# Altium footprint library Stepper_Board.PcbLib: 49 footprints (part 2 of 4)
Each footprint in its own frame and in the unit in brackets; x right, y up, seen from the top. Pads: shape width x height; smd on the part's side, far side on the other; paste and mask are expansions set on the pad; w line width, h text height; cw(c..) or ccw(c..) is an arc to the next point about the centre after c.
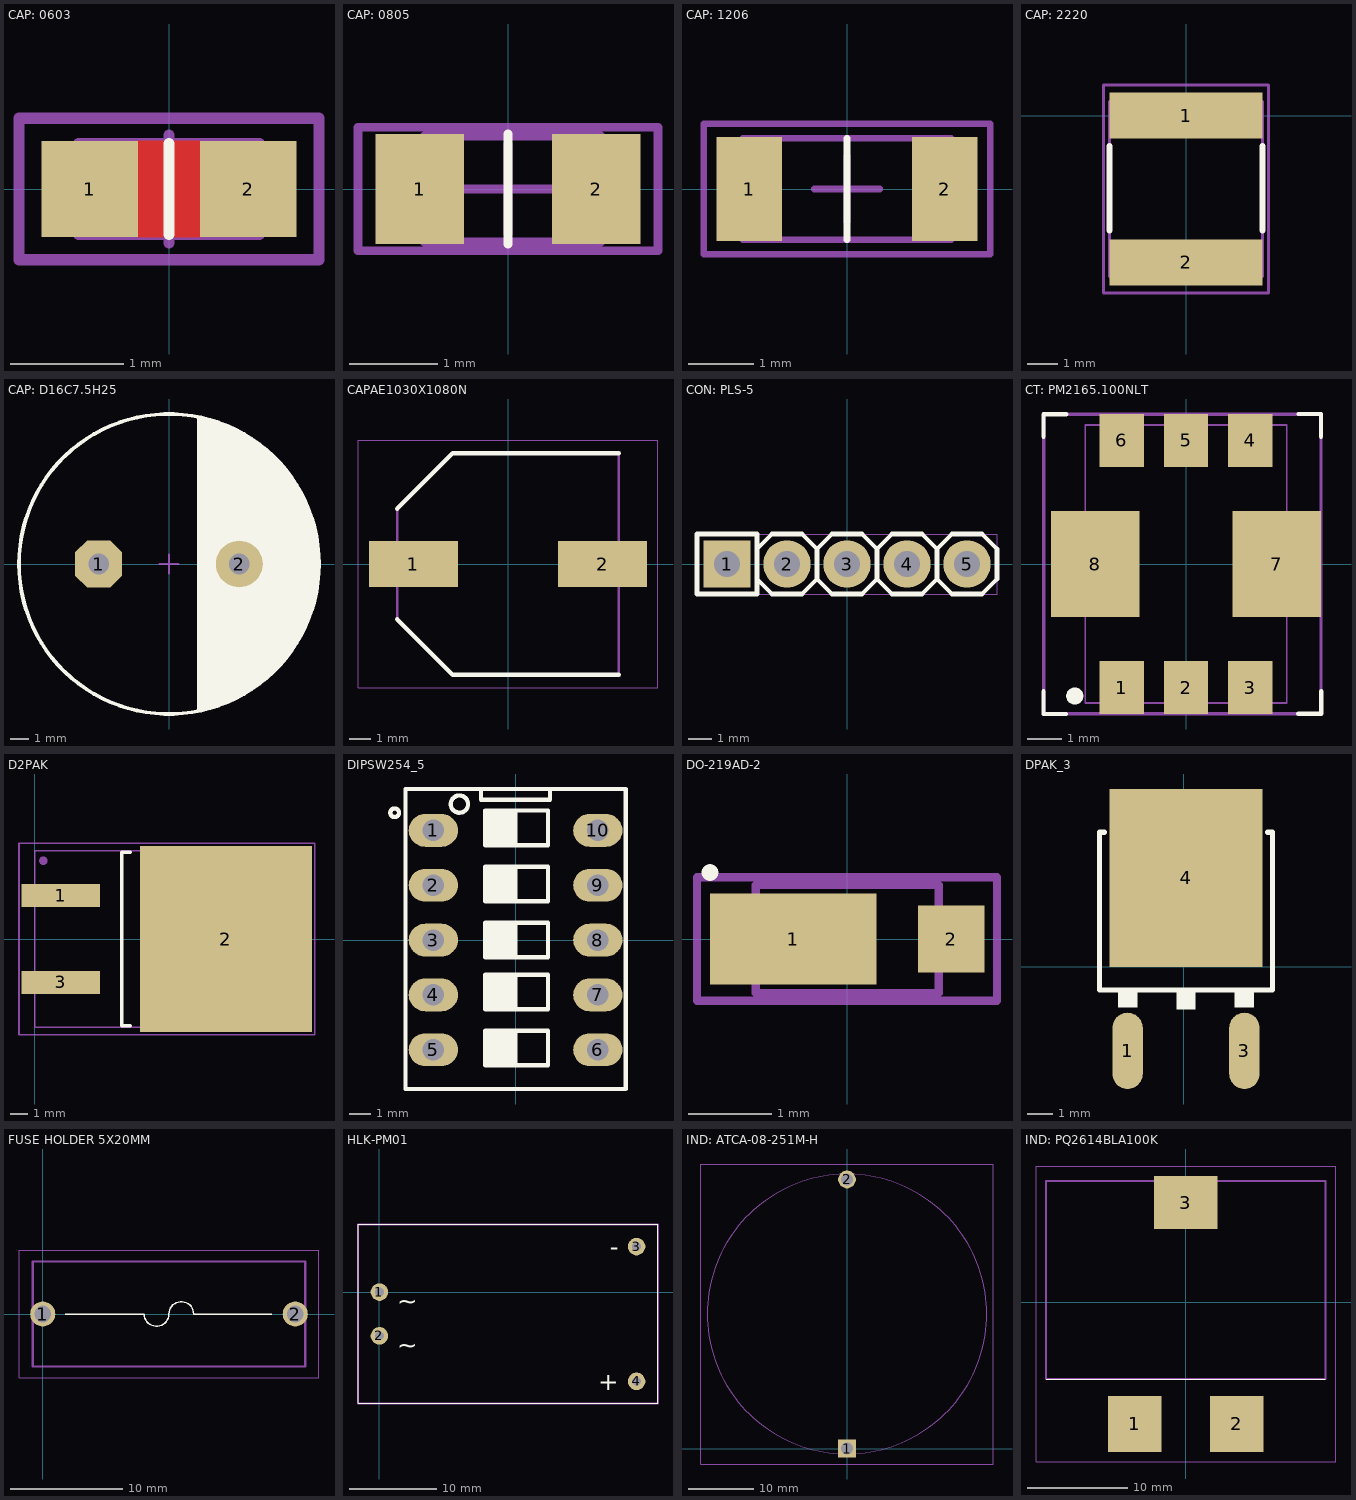
[diagram p1: the footprints below, top view; thin cyan lines are the x and y axes]

## CAP: 0603 [mm]
height 0.45
pads (2):
  rect 0.85x0.85 smd: 1(-0.7,0) 2(0.7,0)
Top Layer:
  pour cut-out: -0.275,0.425 -0.275,-0.425 0.275,-0.425 0.275,0.425
Top Overlay:
  lines w0.1: 0,-0.4 0,0.4
Mechanical 1:
  lines w0.1: -0.8,-0.4 -0.8,0.4 0.8,0.4 0.8,-0.4 -0.8,-0.4
Mechanical 15:
  lines w0.1: -0.475,0 0.475,0 ; 0,-0.475 0,0.475 ; -1.325,-0.625 1.325,-0.625 1.325,0.625 -1.325,0.625 -1.325,-0.625
3D body "SW3dPS-0603 SMD Capacitor.STEP": height 0.3, standoff 0, extent -0.8,-0.4 0.8,0.4

## CAP: 0805 [mm]
height 0.45
pads (2):
  rect 1x1.25 smd: 1(-1,0) 2(1,0)
Top Overlay:
  lines w0.1: 0,-0.625 0,0.625
Mechanical 1:
  lines w0.1: -0.949,-0.6 -0.949,0.6 1.05,0.6 1.05,-0.6 -0.949,-0.6
Mechanical 15:
  lines w0.1: -0.5,0 0.5,0 ; 0,-0.5 0,0.5 ; -1.7,-0.7 1.7,-0.7 1.7,0.7 -1.7,0.7 -1.7,-0.7
3D body "SW3dPS-0805 SMD Capacitor.STEP": height 0.78, standoff 0, extent -1,-0.625 1,0.625

## CAP: 1206 [mm]
height 0.6
pads (2):
  rect 1x1.6 smd: 1(-1.5,0) 2(1.5,0)
Top Overlay:
  lines w0.1: 0,-0.775 0,0.775
Mechanical 1:
  lines w0.1: -1.6,-0.775 1.6,-0.775 1.6,0.775 -1.6,0.775 -1.6,-0.775
Mechanical 15:
  lines w0.1: -0.5,0 0.5,0 ; 0,-0.5 0,0.5 ; -2.2,-1 -2.2,1 2.2,1 2.2,-1 -2.2,-1
3D body "SW3dPS-1206 SMD Capacitor.STEP": height 1, standoff 0, extent -1.6,-0.8 1.6,0.8

## CAP: 2220 [mm]
pads (2):
  rect 5x1.5 smd: 1(0,0) 2(0,-4.8)
Top Overlay:
  lines w0.2: -2.5,-3.75 -2.5,-1 ; 2.5,-3.75 2.5,-1
Mechanical 1:
  lines w0.1: -2.5,-5.25 2.5,-5.25 2.5,0.45 -2.5,0.45 -2.5,-5.25
Mechanical 15:
  lines w0.1: -2.7,-5.8 -2.7,1 -2,1 2.7,1 2.7,-5.8 -2.7,-5.8
3D body "User Library-CAPC5750X23.STEP": height 2.3, standoff 0, extent -2.5,-5.25 2.5,0.45

## CAP: D16C7.5H25 [mm]
height 25
pads (2):
  oct 2.5x2.5 hole 1.1: 1(-3.75,0)
  round 2.5 hole 1.1: 2(3.75,0)
Top Overlay:
  circle w0.2: c0,0 r8
  region: 1.5,7.85 2.1,7.75 2.85,7.5 4.175,6.825 5.375,5.95 6.2,5.05 7.075,3.8 7.525,2.75 7.875,1.425 8,0 7.875,-1.375 7.725,-2.25 7.075,-3.75 6.65,-4.45 6.025,-5.25 5.475,-5.85 4.7,-6.475 3.975,-6.95 3.175,-7.35 2.3,-7.675 1.5,-7.85
Mechanical 1:
  circle w0.1: c0,0 r8
  region: 1.5,7.85 2.1,7.75 2.85,7.5 4.175,6.825 5.375,5.95 6.2,5.05 7.075,3.8 7.525,2.75 7.875,1.425 8,0 7.875,-1.375 7.725,-2.25 7.075,-3.75 6.65,-4.45 6.025,-5.25 5.475,-5.85 4.7,-6.475 3.975,-6.95 3.175,-7.35 2.3,-7.675 1.5,-7.85
Mechanical 15:
  circle w0.1: c0,0 r8
  lines w0.1: -0.5,0 0.5,0 ; 0,-0.5 0,0.5
3D body "User Library-CapAluRadial_D160H250.STEP": height 27, standoff -3, extent -8.25,-8.249 8.25,8.249

## CAPAE1030X1080N [mm]
pads (2):
  rect 4.15x2.15 smd: 1(-4.4,0) 2(4.4,0)
Top Overlay:
  lines w0.2: -5.15,-2.575 -2.575,-5.15 5.15,-5.15 ; -5.15,2.575 -2.575,5.15 5.15,5.15
Mechanical 13:
  lines w0.1: -5.15,-2.575 -2.575,-5.15 5.15,-5.15 5.15,5.15 -2.575,5.15 -5.15,2.575 -5.15,-2.575
Mechanical 15:
  lines w0.05: -6.975,-5.75 -6.975,5.75 6.975,5.75 6.975,-5.75 -6.975,-5.75
3D body "UWT1V331MNL1GS.stp": height 10.8, standoff 0, extent -5.75,-5.25 5.75,5.25

## CON: PLS-5 [mm]
height 10
pads (5):
  rect 2x2 hole 1.1: 1(-5.08,0)
  round 2 hole 1.1: 2(-2.54,0) 3(0,0) 4(2.54,0) 5(5.08,0)
Top Overlay:
  lines w0.2: -3.81,-0.635 -3.175,-1.27 -1.905,-1.27 -1.27,-0.635 ; -3.81,0.635 -3.175,1.27 -1.905,1.27 -1.27,0.635 ; -1.27,-0.635 -1.27,0.635 ; -1.27,-0.635 -0.635,-1.27 0.635,-1.27 1.27,-0.635 ; -1.27,0.635 -0.635,1.27 0.635,1.27 1.27,0.635 ; 1.27,-0.635 1.27,0.635 ; 1.27,-0.635 1.905,-1.27 3.175,-1.27 3.81,-0.635 ; 1.27,0.635 1.905,1.27 3.175,1.27 3.81,0.635 ; 3.81,-0.635 3.81,0.635 ; 3.81,-0.635 4.445,-1.27 5.715,-1.27 6.35,-0.635 6.35,0.635 5.715,1.27 4.445,1.27 3.81,0.635 ; -6.35,-1.27 -6.35,1.27 -3.81,1.27 -3.81,-1.27 -6.35,-1.27
Mechanical 1:
  lines w0.1: -3.81,-0.635 -3.175,-1.27 -1.905,-1.27 -1.27,-0.635 ; -3.81,0.635 -3.175,1.27 -1.905,1.27 -1.27,0.635 ; -1.27,-0.635 -0.635,-1.27 0.635,-1.27 1.27,-0.635 ; -1.27,-0.635 -1.27,0.635 ; -1.27,0.635 -0.635,1.27 0.635,1.27 1.27,0.635 ; 1.27,-0.635 1.905,-1.27 3.175,-1.27 3.81,-0.635 ; 1.27,-0.635 1.27,0.635 ; 1.27,0.635 1.905,1.27 3.175,1.27 3.81,0.635 ; 3.81,-0.635 4.445,-1.27 5.715,-1.27 6.35,-0.635 6.35,0.635 5.715,1.27 4.445,1.27 3.81,0.635 ; 3.81,-0.635 3.81,0.635 ; -6.35,-1.27 -3.81,-1.27 -3.81,1.27 -6.35,1.27 -6.35,-1.27
Mechanical 15:
  lines w0.05: -6.35,-1.27 6.35,-1.27 6.35,1.27 -6.35,1.27 -6.35,-1.27
  lines w0.1: -0.5,0 0.5,0 ; 0,-0.5 0,0.5
3D body "PLS-5.STEP": height 8.54, standoff -3, extent -6.35,-1.27 6.35,1.27

## CT: PM2165.100NLT [mm]
pads (9):
  rect 1.27x1.52 smd: 1(-1.85,-3.555) 2(0,-3.555) 3(1.85,-3.555) 4(1.85,3.555) 5(0,3.555) 6(-1.85,3.555)
  rect 2.54x3.05 smd: 7(2.615,0) 8(-2.615,0)
  round 0.5 on Top Overlay: ""(-3.2,-3.8)
Top Overlay:
  lines w0.127: -4.102,3.667 -4.102,4.315 -3.45,4.315 ; -4.1,-3.665 -4.1,-4.317 -3.452,-4.317 ; 3.235,-4.315 3.887,-4.315 3.887,-3.667 ; 3.237,4.317 3.885,4.317 3.885,3.665
Mechanical 15:
  lines w0.05: -2.9,-4 2.9,-4 2.9,4 -2.9,4 -2.9,-4
  lines w0.1: -4.1,-4.315 -4.1,4.315 3.885,4.315 3.885,-4.315 -4.1,-4.315
3D body "PM2165.100NLT.step": height 5.08, standoff 0, extent -2.9,-4 2.9,4

## D2PAK [mm]
height 2.38
pads (4):
  rect 4.5x1.3 smd: 1(1.5,2.5) 3(1.5,-2.5)
  rect 9.9x10.7 smd: 2(11,0)
  round 0.5 on Mech1: ""(0.5,4.5)
Top Overlay:
  lines w0.2: 5.5,-5 5,-5 5,5 5.5,5
Mechanical 1:
  lines w0.1: 0,-5.08 15.264,-5.08 15.264,5.08 0,5.08 0,-5.08
Mechanical 15:
  lines w0.1: -0.9,-5.5 16.1,-5.5 16.1,5.5 -0.9,5.5 -0.9,-5.5
3D body "User Library-DPAK.STEP": height 4.99, standoff -0.03, extent 0,-5.08 15.264,5.08

## DIPSW254_5 [mil]
pads (10):
  oval 90x60 hole 39.37: 1(-150,200) 2(-150,100) 3(-150,0) 4(-150,-100) 5(-150,-200) 6(150,-200) 7(150,-100) 8(150,0) 9(150,100) 10(150,200)
Top Overlay:
  circle w7.87: c-102.36,248.03 r15.75
  circle w7.87: c-220.47,232.28 r7.87
  rectangle: -55.12,173.23 3.94,236.22
  rectangle: -55.12,70.87 3.94,133.86
  rectangle: -55.12,-31.5 3.94,31.5
  rectangle: -55.12,-125.98 3.94,-62.99
  rectangle: -55.12,-228.35 3.94,-165.35
  lines w7.87: -62.99,275.59 -62.99,255.91 62.99,255.91 62.99,275.59 ; -200.79,-271.65 -200.79,275.59 200.79,275.59 200.79,-271.65 -200.79,-271.65 ; -55.12,-228.35 -55.12,-165.35 59.06,-165.35 59.06,-228.35 -55.12,-228.35 ; -55.12,-125.98 -55.12,-62.99 59.06,-62.99 59.06,-125.98 -55.12,-125.98 ; -55.12,-31.5 -55.12,31.5 59.06,31.5 59.06,-31.5 -55.12,-31.5 ; -55.12,70.87 -55.12,133.86 59.06,133.86 59.06,70.87 -55.12,70.87 ; -55.12,173.23 -55.12,236.22 59.06,236.22 59.06,173.23 -55.12,173.23
3D body "User Library-DIP-10.step": height 275.59, standoff -145.67, extent -194.88,-267.72 194.88,271.65

## DO-219AD-2 [mm]
pads (2):
  rect 2x1.1 smd: 1(-0.65,0)
  rect 0.8x0.8 smd: 2(1.25,0)
Top Overlay:
  lines w0.1: -1.7,0.8 ccw(c-1.65,0.8) -1.6,0.8 ccw(c-1.65,0.8) -1.7,0.8
Mechanical 13:
  lines w0.1: -1.1,-0.65 1.1,-0.65 1.1,0.65 -1.1,0.65 -1.1,-0.65
Mechanical 15:
  lines w0.1: -1.806,-0.744 1.801,-0.744 1.801,0.741 -1.806,0.741 -1.806,-0.744
3D body "V1PM15-M3_H.stp": height 0.68, standoff 0, extent -1.25,-0.648 1.25,0.652

## DPAK_3 [mm] "D-PAK (TO-252), 3-Pads, Body 6.2x6.7mm"
height 2.4
pads (3):
  oval 1.2x3 smd: 1(-2.22,-3.3) 3(2.38,-3.3)
  rect 6x7 smd: 4(0.08,3.5)
Top Overlay:
  rectangle: 1.985,-1.6 2.747,-0.906
  rectangle: -2.587,-1.6 -1.825,-0.906
  rectangle: -0.301,-1.668 0.461,-0.906
  lines w0.2: -3.12,5.3 -3.32,5.3 -3.32,-0.9 3.48,-0.9 3.48,5.3 3.28,5.3
3D body "User Library-DPAK_TO-252AA.step": height 2.37, standoff -0.03, extent -3.287,-3.798 3.447,6.302

## FUSE HOLDER 5X20MM [mm]
pads (2):
  round 2.25 hole 1.5: 1(0,0) 2(22.6,0)
Top Overlay:
  lines w0.127: 2,0 9.091,0 ccw(c10.194,0) 11.297,0 cw(c12.4,0) 13.503,0 ; 13.5,0 20.5,0
Mechanical 13:
  lines w0.2: -0.9,-4.7 23.5,-4.7 23.5,4.7 -0.9,4.7 -0.9,-4.7
Mechanical 15:
  lines w0.1: -2.125,-5.7 24.725,-5.7 24.725,5.7 -2.125,5.7 -2.125,-5.7
3D body "0034.3125.STEP": height 11.15, standoff 5.36, extent 0.7,-2.75 21.9,2.75
3D body "0PTF0078P.stp": height 11.45, standoff -3.55, extent -0.9,-4.7 23.5,4.7

## HLK-PM01 [mm]
height 5.08
pads (4):
  round 2 hole 1: 1(0,0) 2(0,-5) 3(29.4,5.2) 4(29.4,-10.2)
Top Overlay:
  lines w0.1: -2.445,-12.731 -2.445,7.728 31.845,7.728 31.845,-12.731 -2.445,-12.731
  text "~" at 2.023,-7.031 h2.03
  text "~" at 2.023,-2.031 h2.03
  text "-" at 27.377,4.184 h2.03
  text "+" at 27.377,-11.216 h2.03
Mechanical 15:
  lines w0.2: -2.445,-12.739 -2.445,7.722 31.845,7.722 31.845,-12.739 -2.445,-12.739
3D body "User Library-HLK-PM01.step": height 15.23, standoff -4.87, extent -2.318,-12.6 31.682,7.6

## IND: ATCA-08-251M-H [mm]
pads (2):
  rect 2.7x2.7 hole 1.8: 1(0,0)
  round 2.7 hole 1.8: 2(0,40.9)
Mechanical 13:
  lines w0.1: -21.25,20.45 cw(c0,20.45) 21.25,20.45 cw(c0,20.45) -21.25,20.45
Mechanical 15:
  lines w0.1: -22.25,-2.35 -22.25,43.25 22.25,43.25 22.25,-2.35 -22.25,-2.35
3D body "ATCA-08-251M-H.stp": height 21.66, standoff -14.84, extent -21.208,-0.8 21.208,41.7

## IND: PQ2614BLA100K [mm]
pads (3):
  rect 5.33x5.59 smd: 1(-5.1,-12.128) 2(5.05,-12.128)
  rect 6.35x5.28 smd: 3(-0.025,9.947)
Top Overlay:
  lines w0.1: -13.975,-7.672 13.925,-7.672
Mechanical 13:
  lines w0.2: -13.975,-7.672 13.925,-7.672 13.925,12.127 -13.975,12.127 -13.975,-7.672
Mechanical 15:
  lines w0.1: -14.975,-15.923 14.975,-15.923 14.975,13.587 -14.975,13.587 -14.975,-15.923
3D body "PQ2614BLA-100K.stp": height 15.1, standoff 0, extent -13.4,-14.75 13.4,12.425